# Altium footprint library ALL.PcbLib: 385 footprints (part 18 of 25)
Each footprint in its own frame and in the unit in brackets; x right, y up, seen from the top. Pads: shape width x height; smd on the part's side, far side on the other; paste and mask are expansions set on the pad; w line width, h text height; cw(c..) or ccw(c..) is an arc to the next point about the centre after c.
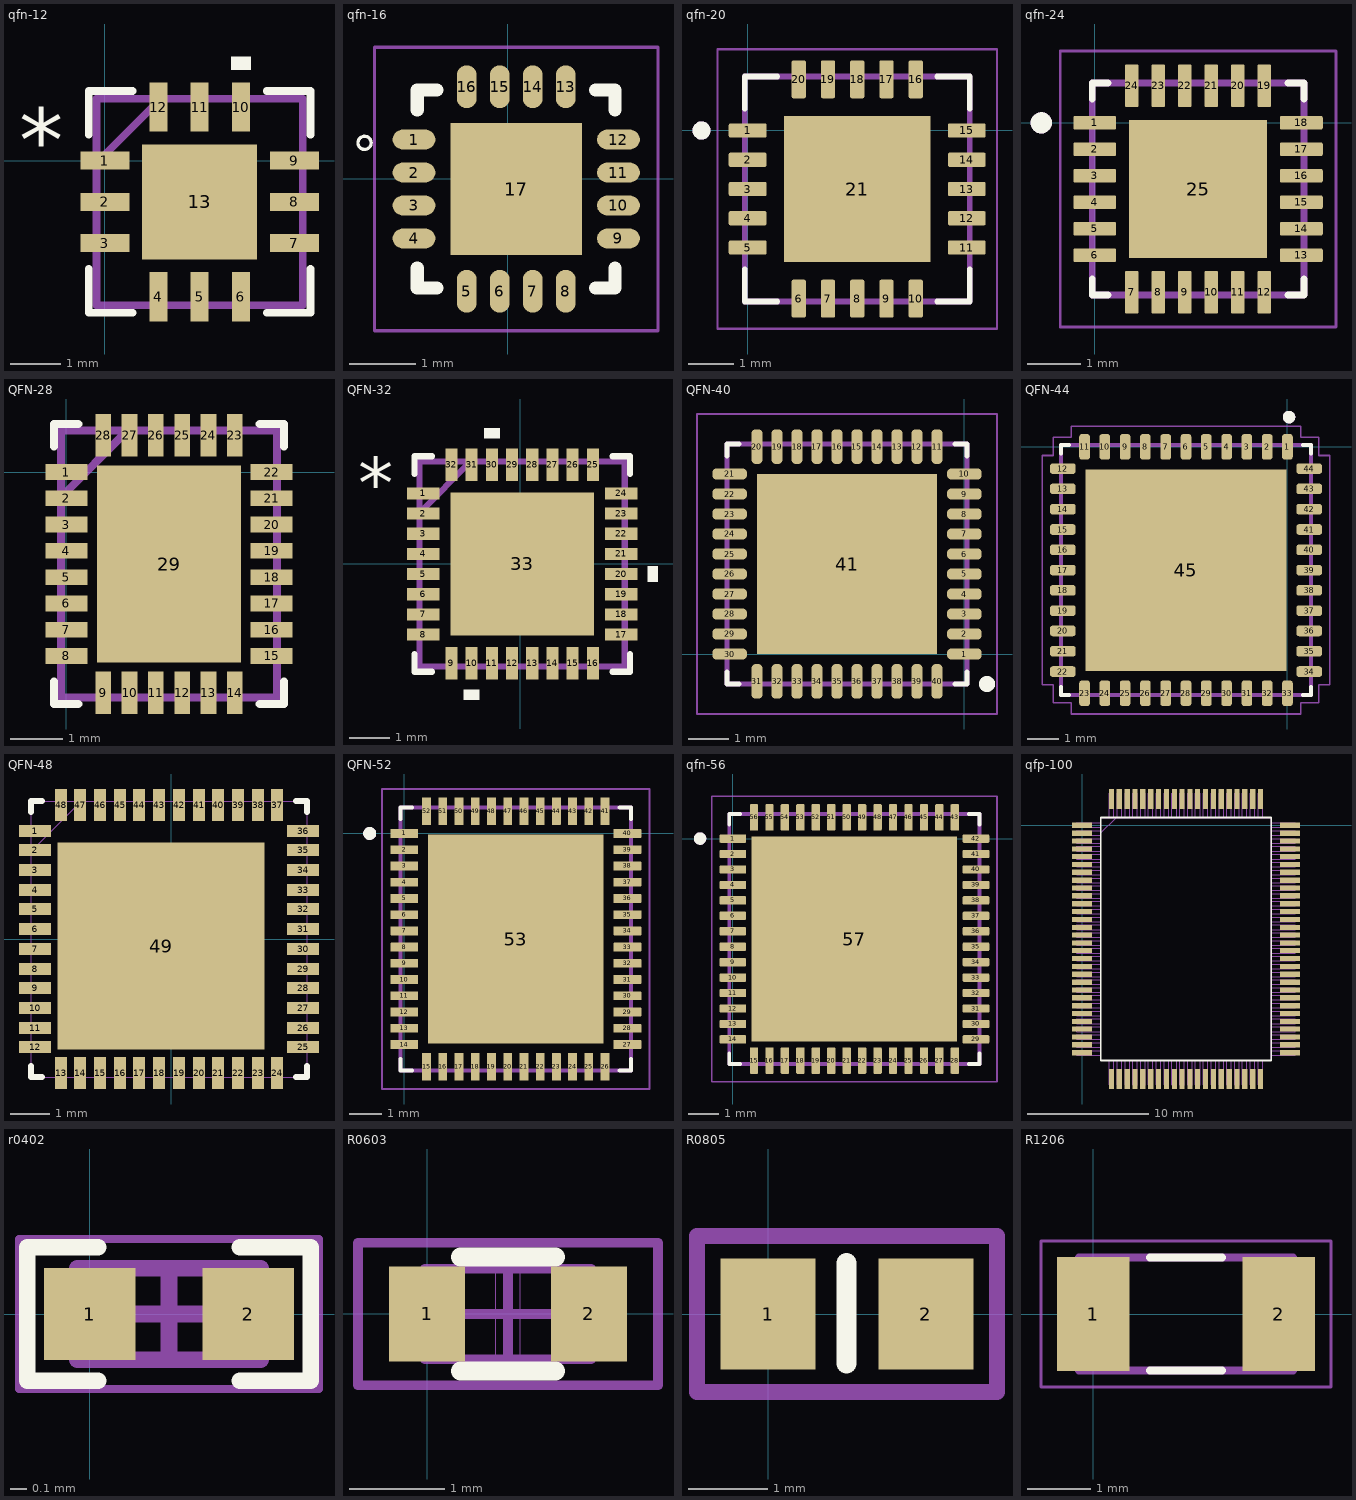
[diagram p17: the footprints below, top view; thin cyan lines are the x and y axes]

## qfn-12 [mil]
pads (13):
  rect 38x14 smd: 1(0,0) 2(0,-32) 3(0,-64) 7(147,-64) 8(147,-32) 9(147,0)
  rect 14x38 smd: 4(41.5,-105.5) 5(73.5,-105.5) 6(105.5,-105.5) 10(105.5,41.5) 11(73.5,41.5) 12(41.5,41.5)
  rect 89x89 smd paste-78.74: 13(73.5,-32)
Top Overlay:
  region: 113,70.5 98,70.5 98,80.5 113,80.5
  lines w6: -12.5,-84 -12.5,-118 21.5,-118 ; -12.5,20 -12.5,54 21.5,54 ; 125.5,-118 159.5,-118 159.5,-84 ; 125.5,54 159.5,54 159.5,20
  text "*" at -66.5,-9 h50
Top Paste:
  region: 118,-76.5 29,-76.5 29,12.5 118,12.5
Mechanical 13:
  lines w6: -6.5,-71 -6.5,-57 ; -6.5,-39 -6.5,-25 ; -6.5,-7 -6.5,7 ; -6.5,-2 43.5,48 ; 34.5,-112 48.5,-112 ; 34.5,48 48.5,48 ; 66.5,-112 80.5,-112 ; 66.5,48 80.5,48 ; 98.5,-112 112.5,-112 ; 98.5,48 112.5,48 ; 153.5,-71 153.5,-57 ; 153.5,-39 153.5,-25 ; 153.5,-7 153.5,7 ; -6.5,-112 -6.5,48 153.5,48 153.5,-112 -6.5,-112
  text "*" at -3.5,-9 h50
3D body "MAX16000CTC+.STEP": height 31.5, standoff 0, extent -5.24,-110.73 152.24,46.74

## qfn-16 [mm]
pads (17):
  oval 0.65x0.3 smd: 1(-1.423,0.598) 2(-1.423,0.098) 3(-1.423,-0.402) 4(-1.423,-0.902) 9(1.677,-0.902) 10(1.677,-0.402) 11(1.677,0.098) 12(1.677,0.598)
  oval 0.3x0.65 smd: 5(-0.623,-1.702) 6(-0.123,-1.702) 7(0.377,-1.702) 8(0.877,-1.702) 13(0.877,1.398) 14(0.377,1.398) 15(-0.123,1.398) 16(-0.623,1.398)
  rect 2x2 smd: 17(0.127,-0.152)
Top Overlay:
  circle w0.05: c-2.173,0.548 r0.1
  lines w0.2: -1.373,-1.352 -1.373,-1.652 -1.073,-1.652 ; -1.373,1.048 -1.373,1.348 -1.073,1.348 ; 1.327,-1.652 1.627,-1.652 1.627,-1.352 ; 1.327,1.348 1.627,1.348 1.627,1.048
Mechanical 15:
  lines w0.05: -2.023,-2.302 -2.023,1.998 2.277,1.998 2.277,-2.302 -2.023,-2.302
3D body "MAX5488ETE+T.STEP": height 0.8, standoff 0, extent -1.373,-1.652 1.627,1.348

## qfn-20 [mm]
pads (21):
  rrect25% 0.84x0.32 smd: 1(0,0) 2(0,-0.65) 3(0,-1.3) 4(0,-1.95) 5(0,-2.6) 11(4.87,-2.6) 12(4.87,-1.95) 13(4.87,-1.3) 14(4.87,-0.65) 15(4.87,0)
  rrect25% 0.32x0.84 smd: 6(1.135,-3.735) 7(1.785,-3.735) 8(2.435,-3.735) 9(3.085,-3.735) 10(3.735,-3.735) 16(3.735,1.135) 17(3.085,1.135) 18(2.435,1.135) 19(1.785,1.135) 20(1.135,1.135)
  rect 3.25x3.25 smd paste-0.595: 21(2.435,-1.3)
Top Overlay:
  circle w0.2: c-1.025,0 r0.1
  lines w0.127: -0.065,-3.08 -0.065,-3.8 0.655,-3.8 ; -0.065,0.48 -0.065,1.2 0.655,1.2 ; 4.215,-3.8 4.935,-3.8 4.935,-3.08 ; 4.215,1.2 4.935,1.2 4.935,0.48
Mechanical 13:
  circle w0.2: c-1.025,0 r0.1
  lines w0.127: -0.065,-3.8 4.935,-3.8 4.935,1.2 -0.065,1.2 -0.065,-3.8
Mechanical 15:
  lines w0.05: -0.67,-4.405 -0.67,1.805 5.54,1.805 5.54,-4.405 -0.67,-4.405
3D body "step_temp.STEP": height 0.8, standoff 0, extent -0.065,-3.8 4.935,1.2

## qfn-24 [mm]
pads (25):
  rrect25% 0.81x0.26 smd: 1(0,0) 2(0,-0.5) 3(0,-1) 4(0,-1.5) 5(0,-2) 6(0,-2.5) 13(3.9,-2.5) 14(3.9,-2) 15(3.9,-1.5) 16(3.9,-1) 17(3.9,-0.5) 18(3.9,0)
  rrect25% 0.26x0.81 smd: 7(0.7,-3.2) 8(1.2,-3.2) 9(1.7,-3.2) 10(2.2,-3.2) 11(2.7,-3.2) 12(3.2,-3.2) 19(3.2,0.7) 20(2.7,0.7) 21(2.2,0.7) 22(1.7,0.7) 23(1.2,0.7) 24(0.7,0.7)
  rect 2.6x2.6 smd paste-2: 25(1.95,-1.25)
Top Overlay:
  circle w0.2: c-1.01,0 r0.1
  lines w0.127: -0.05,-2.95 -0.05,-3.25 0.25,-3.25 ; -0.05,0.45 -0.05,0.75 0.25,0.75 ; 3.65,-3.25 3.95,-3.25 3.95,-2.95 ; 3.65,0.75 3.95,0.75 3.95,0.45
Top Paste:
  region: 2.77,-2.07 1.13,-2.07 1.13,-0.43 2.77,-0.43
Mechanical 13:
  circle w0.2: c-1.01,0 r0.1
  lines w0.127: -0.05,-3.25 3.95,-3.25 3.95,0.75 -0.05,0.75 -0.05,-3.25
Mechanical 15:
  lines w0.05: -0.655,-3.855 4.555,-3.855 4.555,1.355 -0.655,1.355 -0.655,-3.855
3D body "ATSAMD10D13A-MNT (2).STEP": height 0.9, standoff 0, extent -0.018,-3.218 3.982,0.782

## QFN-28 [mm]
pads (29):
  rect 0.805x0.3 smd: 1(0,0) 2(0,-0.5) 3(0,-1) 4(0,-1.5) 5(0,-2) 6(0,-2.5) 7(0,-3) 8(0,-3.5) 15(3.905,-3.5) 16(3.905,-3) 17(3.905,-2.5) 18(3.905,-2) 19(3.905,-1.5) 20(3.905,-1) 21(3.905,-0.5) 22(3.905,0)
  rect 0.3x0.805 smd: 9(0.702,-4.202) 10(1.202,-4.202) 11(1.702,-4.202) 12(2.202,-4.202) 13(2.702,-4.202) 14(3.202,-4.202) 23(3.202,0.702) 24(2.702,0.702) 25(2.202,0.702) 26(1.702,0.702) 27(1.202,0.702) 28(0.702,0.702)
  rect 2.75x3.75 smd paste-3: 29(1.952,-1.75)
Top Overlay:
  lines w0.152: -0.232,-3.985 -0.232,-4.417 0.225,-4.417 ; -0.232,0.485 -0.232,0.917 0.225,0.917 ; 3.68,-4.417 4.137,-4.417 4.137,-3.985 ; 3.68,0.917 4.137,0.917 4.137,0.485
Top Paste:
  region: 1.852,-1.65 0.677,-1.65 0.677,0.025 1.852,0.025
  region: 1.852,-3.525 0.677,-3.525 0.677,-1.85 1.852,-1.85
  region: 3.227,-1.65 2.052,-1.65 2.052,0.025 3.227,0.025
  region: 3.227,-3.525 2.052,-3.525 2.052,-1.85 3.227,-1.85
Mechanical 13:
  lines w0.152: -0.105,-3.655 -0.105,-3.35 ; -0.105,-3.147 -0.105,-2.842 ; -0.105,-2.639 -0.105,-2.36 ; -0.105,-2.156 -0.105,-1.852 ; -0.105,-1.648 -0.105,-1.344 ; -0.105,-1.14 -0.105,-0.861 ; -0.105,-0.658 -0.105,-0.353 ; -0.105,-0.48 1.165,0.79 ; -0.105,-0.15 -0.105,0.155 ; 0.555,-4.29 0.86,-4.29 ; 0.555,0.79 0.86,0.79 ; 1.063,-4.29 1.343,-4.29 ; 1.063,0.79 1.343,0.79 ; 1.546,-4.29 1.851,-4.29 ; 1.546,0.79 1.851,0.79 ; 2.054,-4.29 2.359,-4.29 ; 2.054,0.79 2.359,0.79 ; 2.562,-4.29 2.841,-4.29 ; 2.562,0.79 2.841,0.79 ; 3.045,-4.29 3.349,-4.29 ; 3.045,0.79 3.349,0.79 ; 4.01,-3.655 4.01,-3.35 ; 4.01,-3.147 4.01,-2.842 ; 4.01,-2.639 4.01,-2.36 ; 4.01,-2.156 4.01,-1.852 ; 4.01,-1.648 4.01,-1.344 ; 4.01,-1.14 4.01,-0.861 ; 4.01,-0.658 4.01,-0.353 ; 4.01,-0.15 4.01,0.155 ; -0.105,-4.29 4.01,-4.29 4.01,0.79 -0.105,0.79 -0.105,-4.29
3D body "LT3669EUFD#TRPBF.STEP": height 0.8, standoff 0, extent -0.047,-4.25 3.953,0.75

## QFN-32 [mm]
pads (33):
  rect 0.805x0.3 smd: 1(-2.402,1.75) 2(-2.402,1.25) 3(-2.402,0.75) 4(-2.402,0.25) 5(-2.402,-0.25) 6(-2.402,-0.75) 7(-2.402,-1.25) 8(-2.402,-1.75) 17(2.503,-1.75) 18(2.503,-1.25) 19(2.503,-0.75) 20(2.503,-0.25) 21(2.503,0.25) 22(2.503,0.75) 23(2.503,1.25) 24(2.503,1.75)
  rect 0.3x0.805 smd: 9(-1.699,-2.452) 10(-1.199,-2.452) 11(-0.699,-2.452) 12(-0.199,-2.452) 13(0.301,-2.452) 14(0.801,-2.452) 15(1.301,-2.452) 16(1.801,-2.452) 25(1.801,2.452) 26(1.301,2.452) 27(0.801,2.452) 28(0.301,2.452) 29(-0.199,2.452) 30(-0.699,2.452) 31(-1.199,2.452) 32(-1.699,2.452)
  rect 3.55x3.55 smd paste-3: 33(0.051,0)
Top Overlay:
  region: -0.509,3.109 -0.89,3.109 -0.89,3.363 -0.509,3.363
  region: 3.414,-0.44 3.16,-0.44 3.16,-0.059 3.414,-0.059
  region: -1.009,-3.363 -1.39,-3.363 -1.39,-3.109 -1.009,-3.109
  lines w0.152: -2.616,-2.235 -2.616,-2.667 -2.184,-2.667 ; -2.616,2.235 -2.616,2.667 -2.184,2.667 ; 2.286,-2.667 2.718,-2.667 2.718,-2.235 ; 2.286,2.667 2.718,2.667 2.718,2.235
  text "*" at -4.013,1.372 h1.27
Top Paste:
  region: 1.726,-1.675 0.151,-1.675 0.151,-0.1 1.726,-0.1
  region: 1.726,0.1 0.151,0.1 0.151,1.675 1.726,1.675
  region: -0.049,-1.675 -1.624,-1.675 -1.624,-0.1 -0.049,-0.1
  region: -0.049,0.1 -1.624,0.1 -1.624,1.675 -0.049,1.675
Mechanical 13:
  lines w0.152: -2.489,-1.905 -2.489,-1.6 ; -2.489,-1.397 -2.489,-1.092 ; -2.489,-0.889 -2.489,-0.61 ; -2.489,-0.406 -2.489,-0.102 ; -2.489,0.102 -2.489,0.406 ; -2.489,0.61 -2.489,0.889 ; -2.489,1.092 -2.489,1.397 ; -2.489,1.27 -1.219,2.54 ; -2.489,1.6 -2.489,1.905 ; -1.854,-2.54 -1.549,-2.54 ; -1.854,2.54 -1.549,2.54 ; -1.346,-2.54 -1.041,-2.54 ; -1.346,2.54 -1.041,2.54 ; -0.838,-2.54 -0.559,-2.54 ; -0.838,2.54 -0.559,2.54 ; -0.356,-2.54 -0.051,-2.54 ; -0.356,2.54 -0.051,2.54 ; 0.152,-2.54 0.457,-2.54 ; 0.152,2.54 0.457,2.54 ; 0.66,-2.54 0.94,-2.54 ; 0.66,2.54 0.94,2.54 ; 1.143,-2.54 1.448,-2.54 ; 1.143,2.54 1.448,2.54 ; 1.651,-2.54 1.956,-2.54 ; 1.651,2.54 1.956,2.54 ; 2.591,-1.905 2.591,-1.6 ; 2.591,-1.397 2.591,-1.092 ; 2.591,-0.889 2.591,-0.61 ; 2.591,-0.406 2.591,-0.102 ; 2.591,0.102 2.591,0.406 ; 2.591,0.61 2.591,0.889 ; 2.591,1.092 2.591,1.397 ; 2.591,1.6 2.591,1.905 ; -2.489,-2.54 -2.489,2.54 2.591,2.54 2.591,-2.54 -2.489,-2.54
  text "*" at -2.565,1.372 h1.27
3D body "LTC3331EUH#TRPBF (2).STEP": height 0.8, standoff 0, extent -2.449,-2.5 2.551,2.5

## QFN-40 [mm]
pads (41):
  rrect70% 0.86x0.27 smd: 1(0,0) 2(0,0.5) 3(0,1) 4(0,1.5) 5(0,2) 6(0,2.5) 7(0,3) 8(0,3.5) 9(0,4) 10(0,4.5) 21(-5.87,4.5) 22(-5.87,4) 23(-5.87,3.5) 24(-5.87,3) 25(-5.87,2.5) 26(-5.87,2) 27(-5.87,1.5) 28(-5.87,1) 29(-5.87,0.5) 30(-5.87,0)
  rrect70% 0.27x0.86 smd: 11(-0.685,5.185) 12(-1.185,5.185) 13(-1.685,5.185) 14(-2.185,5.185) 15(-2.685,5.185) 16(-3.185,5.185) 17(-3.685,5.185) 18(-4.185,5.185) 19(-4.685,5.185) 20(-5.185,5.185) 31(-5.185,-0.685) 32(-4.685,-0.685) 33(-4.185,-0.685) 34(-3.685,-0.685) 35(-3.185,-0.685) 36(-2.685,-0.685) 37(-2.185,-0.685) 38(-1.685,-0.685) 39(-1.185,-0.685) 40(-0.685,-0.685)
  rect 4.5x4.5 smd paste-0.824: 41(-2.935,2.25)
Top Overlay:
  circle w0.2: c0.565,-0.75 r0.1
  lines w0.127: -5.935,-0.45 -5.935,-0.75 -5.635,-0.75 ; -5.935,4.95 -5.935,5.25 -5.635,5.25 ; -0.235,-0.75 0.065,-0.75 0.065,-0.45 ; -0.235,5.25 0.065,5.25 0.065,4.95
Mechanical 13:
  lines w0.127: -5.935,-0.75 0.065,-0.75 0.065,5.25 -5.935,5.25 -5.935,-0.75
Mechanical 15:
  lines w0.05: -6.685,-1.5 0.815,-1.5 0.815,6 -6.685,6 -6.685,-1.5
3D body "step_temp.STEP": height 0.8, standoff 0, extent -5.935,-0.75 0.065,5.25

## QFN-44 [mm]
pads (45):
  rrect50% 0.34x0.82 smd: 1(0,0) 2(-0.65,0) 3(-1.3,0) 4(-1.95,0) 5(-2.6,0) 6(-3.25,0) 7(-3.9,0) 8(-4.55,0) 9(-5.2,0) 10(-5.85,0) 11(-6.5,0) 23(-6.5,-7.89) 24(-5.85,-7.89) 25(-5.2,-7.89) 26(-4.55,-7.89) 27(-3.9,-7.89) 28(-3.25,-7.89) 29(-2.6,-7.89) 30(-1.95,-7.89) 31(-1.3,-7.89) 32(-0.65,-7.89) 33(0,-7.89)
  rrect50% 0.82x0.34 smd: 12(-7.195,-0.695) 13(-7.195,-1.345) 14(-7.195,-1.995) 15(-7.195,-2.645) 16(-7.195,-3.295) 17(-7.195,-3.945) 18(-7.195,-4.595) 19(-7.195,-5.245) 20(-7.195,-5.895) 21(-7.195,-6.545) 22(-7.195,-7.195) 34(0.695,-7.195) 35(0.695,-6.545) 36(0.695,-5.895) 37(0.695,-5.245) 38(0.695,-4.595) 39(0.695,-3.945) 40(0.695,-3.295) 41(0.695,-2.645) 42(0.695,-1.995) 43(0.695,-1.345) 44(0.695,-0.695)
  rect 6.45x6.45 smd paste-4: 45(-3.25,-3.945)
Top Overlay:
  circle w0.2: c0.05,0.955 r0.1
  lines w0.127: -7.25,-7.685 -7.25,-7.945 -6.99,-7.945 ; -7.25,-0.205 -7.25,0.055 -6.99,0.055 ; 0.49,-7.945 0.75,-7.945 0.75,-7.685 ; 0.49,0.055 0.75,0.055 0.75,-0.205
Top Paste:
  region: -4.01,-4.705 -4.01,-3.185 -2.49,-3.185 -2.49,-4.705
  region: -1.86,-4.705 -1.86,-3.185 -0.34,-3.185 -0.34,-4.705
  region: -1.86,-2.555 -1.86,-1.035 -0.34,-1.035 -0.34,-2.555
  region: -4.01,-2.555 -4.01,-1.035 -2.49,-1.035 -2.49,-2.555
  region: -6.16,-2.555 -6.16,-1.035 -4.64,-1.035 -4.64,-2.555
  region: -6.16,-4.705 -6.16,-3.185 -4.64,-3.185 -4.64,-4.705
  region: -6.16,-6.855 -6.16,-5.335 -4.64,-5.335 -4.64,-6.855
  region: -4.01,-6.855 -4.01,-5.335 -2.49,-5.335 -2.49,-6.855
  region: -1.86,-6.855 -1.86,-5.335 -0.34,-5.335 -0.34,-6.855
Mechanical 13:
  circle w0.2: c0.05,0.955 r0.1
  lines w0.127: -7.25,-7.945 0.75,-7.945 0.75,0.055 -7.25,0.055 -7.25,-7.945
Mechanical 15:
  lines w0.05: -7.86,-7.615 -7.5,-7.615 -7.5,-8.195 -6.92,-8.195 -6.92,-8.555 0.42,-8.555 0.42,-8.195 1,-8.195 1,-7.615 1.36,-7.615 1.36,-0.275 1,-0.275 1,0.305 0.42,0.305 0.42,0.665 -6.92,0.665 -6.92,0.305 -7.5,0.305 -7.5,-0.275 -7.86,-0.275 -7.86,-7.615
3D body "User Library-QFN44_8x8.STEP": height 0.88, standoff -0.02, extent -7.26,-7.955 0.76,0.065

## QFN-48 [mil]
pads (49):
  rect 32x12 smd: 1(-136,108) 2(-136,89) 3(-136,69) 4(-136,49) 5(-136,30) 6(-136,10) 7(-136,-10) 8(-136,-30) 9(-136,-49) 10(-136,-69) 11(-136,-89) 12(-136,-108) 25(132,-108) 26(132,-89) 27(132,-69) 28(132,-49) 29(132,-30) 30(132,-10) 31(132,10) 32(132,30) 33(132,49) 34(132,69) 35(132,89) 36(132,108)
  rect 12x32 smd: 13(-110,-134) 14(-91,-134) 15(-71,-134) 16(-51,-134) 17(-32,-134) 18(-12,-134) 19(8,-134) 20(28,-134) 21(47,-134) 22(67,-134) 23(87,-134) 24(106,-134) 37(106,134) 38(87,134) 39(67,134) 40(47,134) 41(28,134) 42(8,134) 43(-12,134) 44(-32,134) 45(-51,134) 46(-71,134) 47(-91,134) 48(-110,134)
  rect 207x207 smd: 49(-10,-7)
Top Overlay:
  lines w6: -140,-127 -140,-138 -129,-138 ; -140,127 -140,138 -129,138 ; 125,-138 136,-138 136,-127 ; 125,138 136,138 136,127
Mechanical 13:
  lines w0: -140,-114 -140,-102 ; -140,-94 -140,-83 ; -140,-75 -140,-63 ; -140,-55 -140,-43 ; -140,-35 -140,-24 ; -140,-16 -140,-4 ; -140,4 -140,16 ; -140,24 -140,35 ; -140,43 -140,55 ; -140,63 -140,75 ; -140,83 -140,94 ; -140,88 -90,138 ; -140,102 -140,114 ; -116,-138 -104,-138 ; -116,138 -104,138 ; -96,-138 -85,-138 ; -96,138 -85,138 ; -77,-138 -65,-138 ; -77,138 -65,138 ; -57,-138 -45,-138 ; -57,138 -45,138 ; -37,-138 -26,-138 ; -37,138 -26,138 ; -18,-138 -6,-138 ; -18,138 -6,138 ; 2,-138 14,-138 ; 2,138 14,138 ; 22,-138 33,-138 ; 22,138 33,138 ; 41,-138 53,-138 ; 41,138 53,138 ; 61,-138 73,-138 ; 61,138 73,138 ; 81,-138 92,-138 ; 81,138 92,138 ; 100,-138 112,-138 ; 100,138 112,138 ; 136,-114 136,-102 ; 136,-94 136,-83 ; 136,-75 136,-63 ; 136,-55 136,-43 ; 136,-35 136,-24 ; 136,-16 136,-4 ; 136,4 136,16 ; 136,24 136,35 ; 136,43 136,55 ; 136,63 136,75 ; 136,83 136,94 ; 136,102 136,114 ; -140,-138 136,-138 136,138 -140,138 -140,-138
3D body "ALSRobot-QFN48 7x7.STEP": height -18.9, standoff -50.39, extent -141.38,-139.38 135,137

## QFN-52 [mm]
pads (53):
  rrect13% 0.86x0.27 smd: 1(0,0) 2(0,-0.5) 3(0,-1) 4(0,-1.5) 5(0,-2) 6(0,-2.5) 7(0,-3) 8(0,-3.5) 9(0,-4) 10(0,-4.5) 11(0,-5) 12(0,-5.5) 13(0,-6) 14(0,-6.5) 27(6.87,-6.5) 28(6.87,-6) 29(6.87,-5.5) 30(6.87,-5) 31(6.87,-4.5) 32(6.87,-4) 33(6.87,-3.5) 34(6.87,-3) 35(6.87,-2.5) 36(6.87,-2) 37(6.87,-1.5) 38(6.87,-1) 39(6.87,-0.5) 40(6.87,0)
  rrect13% 0.27x0.86 smd: 15(0.685,-7.185) 16(1.185,-7.185) 17(1.685,-7.185) 18(2.185,-7.185) 19(2.685,-7.185) 20(3.185,-7.185) 21(3.685,-7.185) 22(4.185,-7.185) 23(4.685,-7.185) 24(5.185,-7.185) 25(5.685,-7.185) 26(6.185,-7.185) 41(6.185,0.685) 42(5.685,0.685) 43(5.185,0.685) 44(4.685,0.685) 45(4.185,0.685) 46(3.685,0.685) 47(3.185,0.685) 48(2.685,0.685) 49(2.185,0.685) 50(1.685,0.685) 51(1.185,0.685) 52(0.685,0.685)
  rect 5.41x6.45 smd paste-4: 53(3.435,-3.25)
Top Overlay:
  circle w0.2: c-1.065,0 r0.1
  lines w0.127: -0.115,-6.95 -0.115,-7.3 0.235,-7.3 ; -0.115,0.45 -0.115,0.8 0.235,0.8 ; 6.635,-7.3 6.985,-7.3 6.985,-6.95 ; 6.635,0.8 6.985,0.8 6.985,0.45
Top Paste:
  region: 5.715,-4.04 3.865,-4.04 3.865,-2.46 5.715,-2.46
  region: 3.005,-4.04 1.155,-4.04 1.155,-2.46 3.005,-2.46
  region: 3.005,-1.89 1.155,-1.89 1.155,-0.31 3.005,-0.31
  region: 5.715,-1.89 3.865,-1.89 3.865,-0.31 5.715,-0.31
  region: 3.005,-6.19 1.155,-6.19 1.155,-4.61 3.005,-4.61
  region: 5.715,-6.19 3.865,-6.19 3.865,-4.61 5.715,-4.61
Mechanical 13:
  circle w0.2: c-1.065,0 r0.1
  lines w0.127: -0.115,-7.3 6.985,-7.3 6.985,0.8 -0.115,0.8 -0.115,-7.3
Mechanical 15:
  lines w0.05: -0.685,-7.87 7.555,-7.87 7.555,1.37 -0.685,1.37 -0.685,-7.87
3D body "User Library-QFN-54(7x8).STEP": height 0.7, standoff -0.05, extent -0.1,-7.285 6.97,0.785

## qfn-56 [mm]
pads (57):
  rrect25% 0.86x0.27 smd: 1(0,0) 2(0,-0.5) 3(0,-1) 4(0,-1.5) 5(0,-2) 6(0,-2.5) 7(0,-3) 8(0,-3.5) 9(0,-4) 10(0,-4.5) 11(0,-5) 12(0,-5.5) 13(0,-6) 14(0,-6.5) 29(7.87,-6.5) 30(7.87,-6) 31(7.87,-5.5) 32(7.87,-5) 33(7.87,-4.5) 34(7.87,-4) 35(7.87,-3.5) 36(7.87,-3) 37(7.87,-2.5) 38(7.87,-2) 39(7.87,-1.5) 40(7.87,-1) 41(7.87,-0.5) 42(7.87,0)
  rrect25% 0.27x0.86 smd: 15(0.685,-7.185) 16(1.185,-7.185) 17(1.685,-7.185) 18(2.185,-7.185) 19(2.685,-7.185) 20(3.185,-7.185) 21(3.685,-7.185) 22(4.185,-7.185) 23(4.685,-7.185) 24(5.185,-7.185) 25(5.685,-7.185) 26(6.185,-7.185) 27(6.685,-7.185) 28(7.185,-7.185) 43(7.185,0.685) 44(6.685,0.685) 45(6.185,0.685) 46(5.685,0.685) 47(5.185,0.685) 48(4.685,0.685) 49(4.185,0.685) 50(3.685,0.685) 51(3.185,0.685) 52(2.685,0.685) 53(2.185,0.685) 54(1.685,0.685) 55(1.185,0.685) 56(0.685,0.685)
  rect 6.65x6.65 smd paste-2.625: 57(3.935,-3.25)
Top Overlay:
  circle w0.2: c-1.06,0 r0.1
  lines w0.127: -0.115,-6.955 -0.115,-7.3 0.23,-7.3 ; -0.115,0.455 -0.115,0.8 0.23,0.8 ; 7.64,-7.3 7.985,-7.3 7.985,-6.955 ; 7.64,0.8 7.985,0.8 7.985,0.455
Top Paste:
  region: 2.42,-1.735 1.02,-1.735 1.02,-0.335 2.42,-0.335
  region: 4.64,-1.735 3.24,-1.735 3.24,-0.335 4.64,-0.335
  region: 6.86,-1.735 5.46,-1.735 5.46,-0.335 6.86,-0.335
  region: 2.42,-3.955 1.02,-3.955 1.02,-2.555 2.42,-2.555
  region: 6.86,-3.955 5.46,-3.955 5.46,-2.555 6.86,-2.555
  region: 2.42,-6.175 1.02,-6.175 1.02,-4.775 2.42,-4.775
  region: 4.64,-6.175 3.24,-6.175 3.24,-4.775 4.64,-4.775
  region: 6.86,-6.175 5.46,-6.175 5.46,-4.775 6.86,-4.775
Mechanical 13:
  circle w0.2: c-1.06,0 r0.1
  lines w0.127: -0.115,-7.3 7.985,-7.3 7.985,0.8 -0.115,0.8 -0.115,-7.3
Mechanical 15:
  lines w0.05: -0.68,-7.865 8.55,-7.865 8.55,1.365 -0.68,1.365 -0.68,-7.865
3D body "step_temp.STEP": height 0.8, standoff 0, extent -0.065,-7.25 7.935,0.75

## qfp-100 [mil]
pads (100):
  rect 65x17 smd: 1(0,0) 2(0,-26) 3(0,-51) 4(0,-77) 5(0,-102) 6(0,-128) 7(0,-153) 8(0,-179) 9(0,-205) 10(0,-230) 11(0,-256) 12(0,-281) 13(0,-307) 14(0,-333) 15(0,-358) 16(0,-384) 17(0,-409) 18(0,-435) 19(0,-461) 20(0,-486) 21(0,-512) 22(0,-537) 23(0,-563) 24(0,-589) 25(0,-614) 26(0,-640) 27(0,-665) 28(0,-691) 29(0,-716) 30(0,-742) 51(678,-742) 52(678,-716) 53(678,-691) 54(678,-665) 55(678,-640) 56(678,-614) 57(678,-589) 58(678,-563) 59(678,-537) 60(678,-512) 61(678,-486) 62(678,-461) 63(678,-435) 64(678,-409) 65(678,-384) 66(678,-358) 67(678,-333) 68(678,-307) 69(678,-281) 70(678,-256) 71(678,-230) 72(678,-205) 73(678,-179) 74(678,-153) 75(678,-128) 76(678,-102) 77(678,-77) 78(678,-51) 79(678,-26) 80(678,0)
  rect 17x65 smd: 31(96,-828) 32(121,-828) 33(147,-828) 34(173,-828) 35(198,-828) 36(224,-828) 37(249,-828) 38(275,-828) 39(301,-828) 40(326,-828) 41(352,-828) 42(377,-828) 43(403,-828) 44(429,-828) 45(454,-828) 46(480,-828) 47(505,-828) 48(531,-828) 49(557,-828) 50(582,-828) 81(582,86) 82(557,86) 83(531,86) 84(505,86) 85(480,86) 86(454,86) 87(429,86) 88(403,86) 89(377,86) 90(352,86) 91(326,86) 92(301,86) 93(275,86) 94(249,86) 95(224,86) 96(198,86) 97(173,86) 98(147,86) 99(121,86) 100(96,86)
Top Overlay:
  lines w6: 61,-767 61,25 617,25 617,-767 61,-767
Mechanical 13:
  drawing of 406 lines, arcs and shapes, not listed
3D body "User Library-QFP-100.STEP": height 135.93, standoff -3.3, extent 1.92,-827.17 679.09,86.22

## r0402 [mm]
pads (2):
  rect 0.55x0.55 smd mask+0.06: 1(0,0) 2(0.95,0)
Top Overlay:
  lines w0.1: 0.05,-0.4 -0.375,-0.4 -0.375,0.4 0.05,0.4 ; 0.9,-0.4 1.325,-0.4 1.325,0.4 0.9,0.4
Mechanical 13:
  lines w0.1: -0.075,-0.275 1.025,-0.275 1.025,0.275 -0.075,0.275 -0.075,-0.275
Mechanical 15:
  lines w0.05: -0.425,-0.45 1.375,-0.45 1.375,0.45 -0.425,0.45 -0.425,-0.45
  lines w0.1: 0.2,0 0.75,0 ; 0.475,-0.275 0.475,0.275
3D body "GRM155R71H162JA01D.STEP": height 0.23, standoff -0.23, extent -0.025,-0.25 0.975,0.25

## R0603 [mm]
pads (2):
  rect 0.8x1 smd: 1(0,0) 2(1.7,0)
Top Overlay:
  lines w0.2: 0.35,-0.6 1.35,-0.6 ; 0.35,0.6 1.35,0.6
Mechanical 10:
  lines w0.01: 0.723,-0.508 0.952,-0.508 0.977,-0.533 0.977,0.508 0.723,0.508 0.723,-0.508
Mechanical 13:
  lines w0.1: -0.025,-0.475 1.725,-0.475 1.725,0.475 -0.025,0.475 -0.025,-0.475
Mechanical 15:
  lines w0.1: 0.375,0 1.325,0 ; 0.85,-0.475 0.85,0.475 ; -0.725,-0.75 2.425,-0.75 2.425,0.75 -0.725,0.75 -0.725,-0.75
3D body "0603R.step": height 0.8, standoff 0, extent -0.38,-0.4 2.08,0.4

## R0805 [mm]
pads (2):
  rect 1.2x1.4 smd: 1(0,0) 2(2,0)
Top Overlay:
  lines w0.254: 0.994,-0.625 0.994,0.645
Mechanical 15:
  lines w0.203: -0.9,-0.991 2.9,-0.991 2.9,0.991 -0.9,0.991 -0.9,-0.991
3D body "User Library-0805 SMD Resistor.step": height 0.78, standoff 0, extent -0.006,-0.625 1.994,0.625

## R1206 [mm]
pads (2):
  rect 1.16x1.82 smd: 1(0,0) 2(2.95,0)
Top Overlay:
  lines w0.127: 0.905,-0.9 2.045,-0.9 ; 0.905,0.9 2.045,0.9
Mechanical 13:
  lines w0.127: -0.225,-0.9 3.175,-0.9 3.175,0.9 -0.225,0.9 -0.225,-0.9
Mechanical 15:
  lines w0.05: -0.833,-1.158 3.783,-1.158 3.783,1.158 -0.833,1.158 -0.833,-1.158
3D body "CircuitWorks-RESISTOR 1206.STEP": height 0.53, standoff -0.03, extent -0.076,-0.83 3.124,0.83